# Altium footprint library DD2088PoE_Daisy_Chain.PcbLib: 62 footprints (part 4 of 4)
Each footprint in its own frame and in the unit in brackets; x right, y up, seen from the top. Pads: shape width x height; smd on the part's side, far side on the other; paste and mask are expansions set on the pad; w line width, h text height; cw(c..) or ccw(c..) is an arc to the next point about the centre after c.
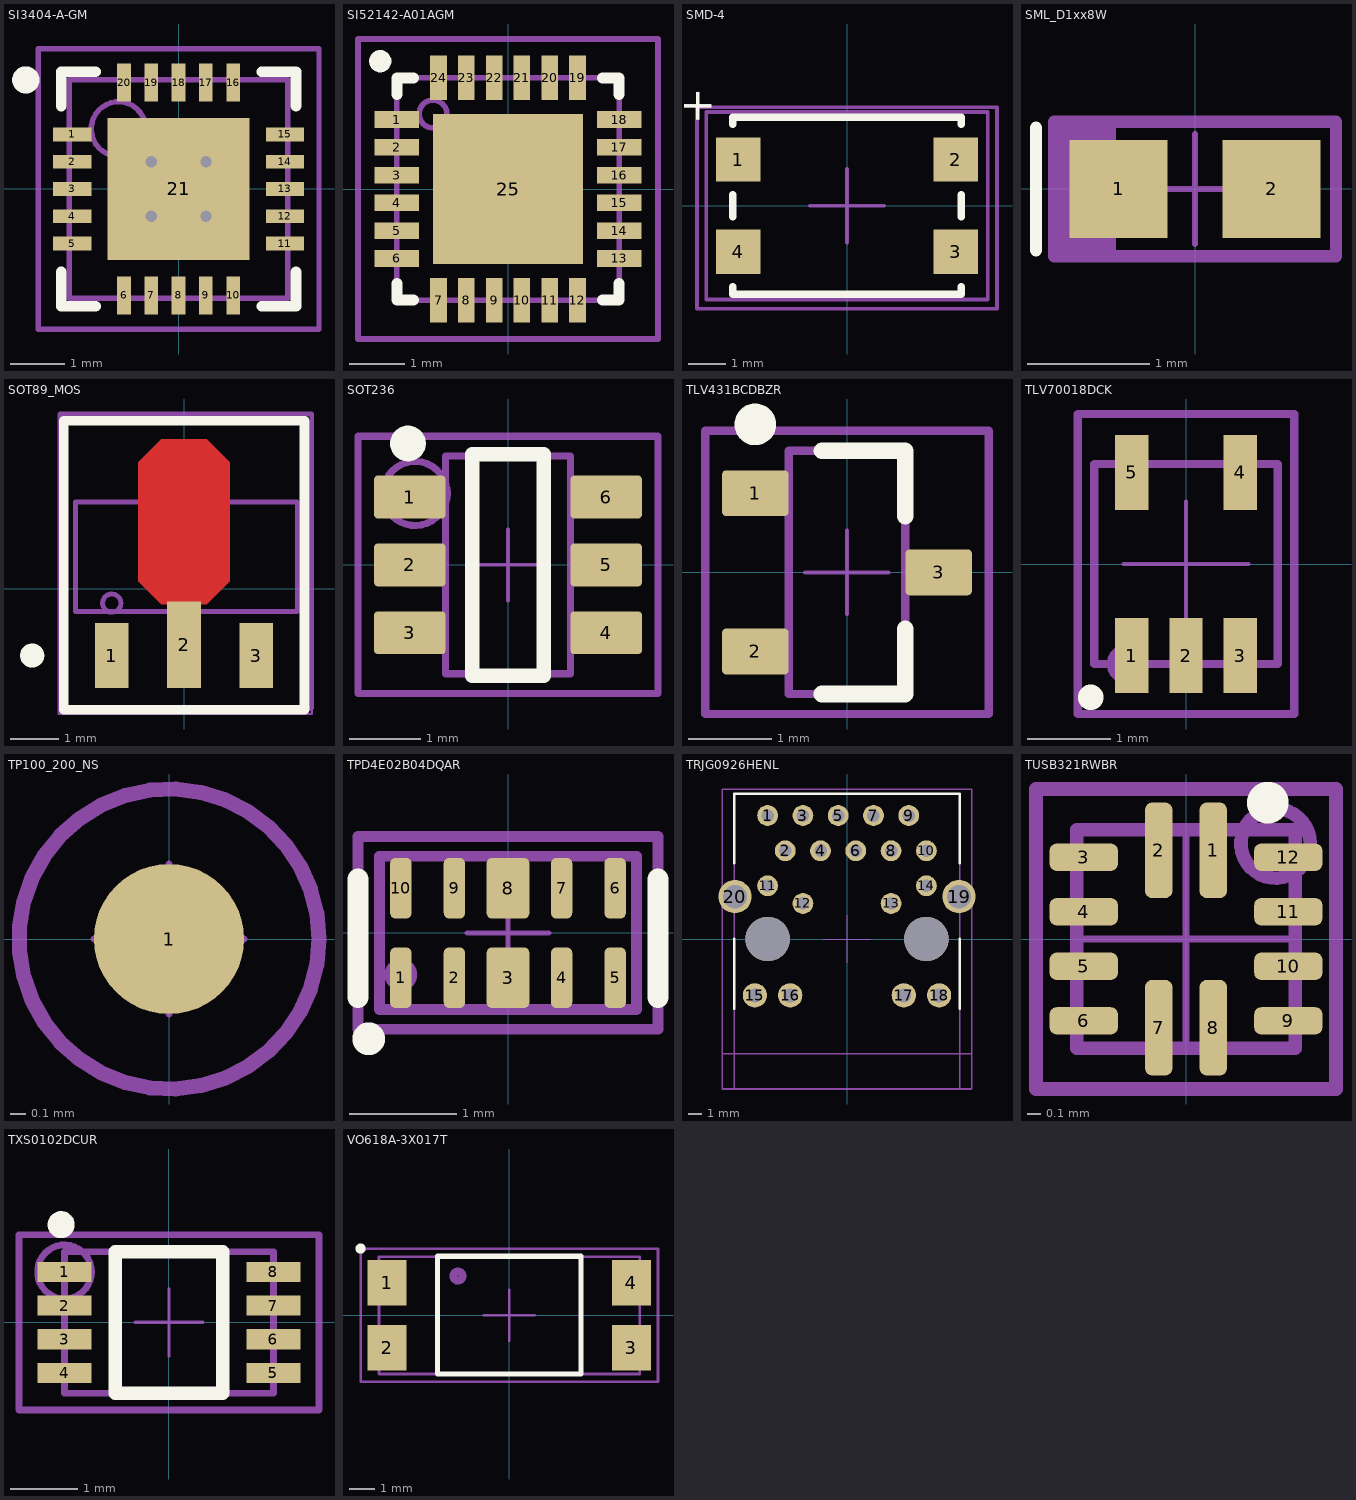
[diagram p3: the footprints below, top view; thin cyan lines are the x and y axes]

## SI3404-A-GM [mm] "QFN, 20-Leads, Body 4.00x4.00mm, Pitch 0.50mm, Thermal Pad 2.60x2.60mm, IPC Medium Density"
height 0.9
pads (21):
  rect 0.7x0.25 smd: 1(-1.95,1) 2(-1.95,0.5) 3(-1.95,0) 4(-1.95,-0.5) 5(-1.95,-1) 11(1.95,-1) 12(1.95,-0.5) 13(1.95,0) 14(1.95,0.5) 15(1.95,1)
  rect 0.25x0.7 smd: 6(-1,-1.95) 7(-0.5,-1.95) 8(0,-1.95) 9(0.5,-1.95) 10(1,-1.95) 16(1,1.95) 17(0.5,1.95) 18(0,1.95) 19(-0.5,1.95) 20(-1,1.95)
  rect 2.6x2.6 smd paste-5: 21(0,0)
via 0.5,-0.5 diameter 0.406 hole 0.203
via -0.5,-0.5 diameter 0.406 hole 0.203
via -0.5,0.5 diameter 0.406 hole 0.203
via 0.5,0.5 diameter 0.406 hole 0.203
Top Overlay:
  circle w0.25: c-2.8,2 r0.125
  lines w0.2: -2.15,-1.525 -2.15,-2.15 -1.525,-2.15 ; -2.15,1.525 -2.15,2.15 -1.525,2.15 ; 1.525,-2.15 2.15,-2.15 2.15,-1.525 ; 1.525,2.15 2.15,2.15 2.15,1.525
Top Paste:
  region: -0.3,0.3 0.3,0.3 0.3,-0.3 -0.3,-0.3
  region: 0.7,0.3 1.3,0.3 1.3,-0.3 0.7,-0.3
  region: -0.3,0.7 -0.3,1.3 0.3,1.3 0.3,0.7
  region: -0.7,-0.3 -1.3,-0.3 -1.3,0.3 -0.7,0.3
  region: 0.3,-0.7 0.3,-1.3 -0.3,-1.3 -0.3,-0.7
  region: 1.3,-0.7 1.3,-1.3 0.7,-1.3 0.7,-0.7
  region: 0.7,1.3 1.3,1.3 1.3,0.7 0.7,0.7
  region: -1.3,0.7 -1.3,1.3 -0.7,1.3 -0.7,0.7
  region: -0.7,-1.3 -1.3,-1.3 -1.3,-0.7 -0.7,-0.7
Top Assembly:
  circle w0.1: c-1.1,1.1 r0.5
  lines w0.1: -2.575,-2.575 2.575,-2.575 2.575,2.575 -2.575,2.575 -2.575,-2.575
  text "'.Designator'" at 0,0 h1
Top Courtyard:
  lines w0.05: -0.5,0 0.5,0 ; 0,-0.5 0,0.5 ; -2.575,-2.575 2.575,-2.575 2.575,2.575 -2.575,2.575 -2.575,-2.575
Top Component Outline:
  lines w0.1: -2.001,-2.001 2.001,-2.001 2.001,2.001 -2.001,2.001 -2.001,-2.001
3D body "Si3404-A-GM.step": height 0.9, standoff 0, extent -2.001,-2.001 2.001,2.001

## SI52142-A01AGM [mm] "24-QFN (4x4)"
height 0.8
pads (25):
  rect 0.8x0.3 smd paste-0.025 mask+0.05: 1(-2,1.25) 2(-2,0.75) 3(-2,0.25) 4(-2,-0.25) 5(-2,-0.75) 6(-2,-1.25) 13(2,-1.25) 14(2,-0.75) 15(2,-0.25) 16(2,0.25) 17(2,0.75) 18(2,1.25)
  rect 0.3x0.8 smd paste-0.025 mask+0.05: 7(-1.25,-2) 8(-0.75,-2) 9(-0.25,-2) 10(0.25,-2) 11(0.75,-2) 12(1.25,-2) 19(1.25,2) 20(0.75,2) 21(0.25,2) 22(-0.25,2) 23(-0.75,2) 24(-1.25,2)
  rect 2.7x2.7 smd paste-3 mask+0.05: 25(0,0)
Top Overlay:
  circle w0.2: c-2.3,2.3 r0.1
  lines w0.2: -2,-1.7 -2,-2 -1.7,-2 ; -2,1.7 -2,2 -1.7,2 ; 1.7,-2 2,-2 2,-1.7 ; 1.7,2 2,2 2,1.7
Top Paste:
  region: 0.1,0.1 1.2,0.1 1.2,1.2 0.1,1.2
  region: -0.1,0.1 -0.1,1.2 -1.2,1.2 -1.2,0.1
  region: -0.1,-0.1 -1.2,-0.1 -1.2,-1.2 -0.1,-1.2
  region: 0.1,-0.1 0.1,-1.2 1.2,-1.2 1.2,-0.1
Top Assembly:
  circle w0.1: c-1.35,1.35 r0.25
  lines w0.1: -2.7,-2.7 -2.7,2.7 2.7,2.7 2.7,-2.7 -2.7,-2.7
  text "'.Designator'" at -0.263,-0.202 h1
Top Courtyard:
  lines w0.05: -1.002,0 0,0 ; 0,-1.002 0,0 ; 0,1.002 0,0 ; 1.002,0 0,0 ; -2.7,-2.7 -2.7,2.7 2.7,2.7 2.7,-2.7 -2.7,-2.7
Top Component Outline:
  lines w0.1: -2,-2 -2,2 2,2 2,-2 -2,-2
3D body "User Library-QFN24-0_5.STEP": height 1, standoff 0, extent -2,-2 2,2

## SMD-4 [mm]
pads (4):
  rect 1.2x1.2 smd mask+0.07: 1(-2.95,1.25) 2(2.95,1.25) 3(2.95,-1.25) 4(-2.95,-1.25)
Top Overlay:
  lines w0.2: -3.1,-2.2 -3.1,-2.4 3.1,-2.4 3.1,-2.2 ; -3.1,-0.3 -3.1,0.3 ; -3.1,2.2 -3.1,2.4 3.1,2.4 3.1,2.2 ; 3.1,-0.3 3.1,0.3
  text "+" at -3.361,2.2 h1.5
Top Assembly:
  lines w0.1: -4.064,-2.794 4.064,-2.794 4.064,2.667 -4.064,2.667 -4.064,-2.794
  text "'.Designator'" at -1.778,-0.254 h1
Top Courtyard:
  lines w0.05: -4.064,-2.794 4.064,-2.794 4.064,2.667 -4.064,2.667 -4.064,-2.794
  lines w0.1: -1,0 0,0 ; 0,-1 0,0 ; 0,1 0,0 ; 1,0 0,0
Top Component Outline:
  lines w0.1: -3.81,-2.54 3.81,-2.54 3.81,2.54 -3.81,2.54 -3.81,-2.54
3D body "CD-HD0x_3d.stp": height 1.06, standoff -0.01, extent -3.075,-2.375 3.075,2.375

## SML_D1xx8W [mm] "Rohm LED SML_D1 series - Chip Diode, 2-Leads, Body 1.60x0.80mm, IPC High Density"
height 0.55
pads (2):
  rect 0.8x0.8 smd: 1(-0.625,0) 2(0.625,0)
Top Overlay:
  lines w0.1: -1.3,-0.5 -1.3,0.5
Top Assembly:
  rectangle: -1.15,-0.55 -0.698,0.55
  lines w0.1: -0.698,-0.55 -0.698,0.55 ; -1.15,-0.55 -1.15,0.55 1.15,0.55 1.15,-0.55 -1.15,-0.55
  text "'.Designator'" at -0.577,-0.264 h1
Top Courtyard:
  lines w0.05: -0.45,0 0.45,0 ; 0,-0.45 0,0.45 ; -1.15,-0.55 -1.15,0.55 1.15,0.55 1.15,-0.55 -1.15,-0.55
3D body "User Library-LED_0603_WS.STEP": height 0.6, standoff 0, extent -0.8,-0.4 0.8,0.4

## SOT89_MOS [mm] "SOT-89; Body 4.6 x 4.25 mm, inc. leads (LxW max)"
height 1.6
pads (3):
  rect 0.7x1.35 smd: 1(-1.5,-1.388) 3(1.5,-1.388)
  rect 0.7x1.8 smd: 2(0,-1.162)
Top Layer:
  region: -0.475,-0.325 -0.95,0.15 -0.95,2.625 -0.475,3.1 0.475,3.1 0.95,2.625 0.95,0.15 0.475,-0.325
Top Overlay:
  circle w0.25: c-3.15,-1.388 r0.125
  lines w0.2: -2.5,-2.512 -2.5,3.487 2.5,3.487 2.5,-2.512 -2.5,-2.512
Top Paste:
  region: -0.35,0.075 -0.7,0.425 -0.7,2.5 -0.35,2.85 0.325,2.85 0.7,2.475 0.7,0.425 0.35,0.075
Top Solder:
  region: -0.475,-0.375 -0.975,0.125 -0.975,2.65 -0.5,3.125 0.5,3.125 0.975,2.65 0.975,0.125 0.475,-0.375
Top Assembly:
  circle w0.1: c-1.5,-0.3 r0.19
  lines w0.1: -2.575,-2.475 2.65,-2.475 2.65,3.625 -2.575,3.625 -2.575,-2.475
  text ".Designator" at 0,0 h1
Top Courtyard:
  lines w0.05: -0.5,0 0.5,0 ; 0,-0.5 0,0.5 ; -2.6,-2.6 2.65,-2.6 2.65,3.6 -2.6,3.6 -2.6,-2.6
Top Component Outline:
  lines w0.1: -2.25,-0.475 -2.25,1.8 2.35,1.8 2.35,-0.475 -2.25,-0.475
3D body "SOT-89.step": height 1.35, standoff 0, extent -2.25,-1.65 2.35,2.6

## SOT236 [mm] "SOT23-6 60mil"
height 1.524
pads (6):
  rrect17% 1x0.6 smd: 1(-1.375,0.95) 2(-1.375,0) 3(-1.375,-0.95) 4(1.375,-0.95) 5(1.375,0) 6(1.375,0.95)
Top Overlay:
  circle w0.25: c-1.4,1.7 r0.125
  lines w0.2: -0.5,-1.55 -0.5,1.55 0.5,1.55 0.5,-1.55 -0.5,-1.55
Top Assembly:
  circle w0.1: c-1.3,1 r0.449
  lines w0.1: -2.1,-1.8 -2.1,1.8 2.1,1.8 2.1,-1.8 -2.1,-1.8
  text ".Designator" at 0,0 h1
Top Courtyard:
  lines w0.05: -0.5,0 0.5,0 ; 0,-0.5 0,0.5 ; -2.1,-1.8 -2.1,1.8 2.1,1.8 2.1,-1.8 -2.1,-1.8
Top Component Outline:
  lines w0.1: -0.875,-1.525 -0.875,1.525 0.875,1.525 0.875,-1.525 -0.875,-1.525
3D body "DBV0006AakaMF06A.stp": height 1.11, standoff -0.01, extent -1.422,-1.461 1.422,1.46

## TLV431BCDBZR [mm] "SOT-23-3"
height 1.12
pads (3):
  rrect18% 0.8x0.55 smd: 1(-1.1,0.95) 2(-1.1,-0.95) 3(1.1,0)
Top Overlay:
  circle w0.25: c-1.1,1.775 r0.125
  lines w0.2: -0.3,-1.461 0.7,-1.461 0.7,-0.675 ; -0.3,1.46 0.7,1.46 0.7,0.675
Top Assembly:
  lines w0.1: -1.7,-1.7 -1.7,1.7 1.7,1.7 1.7,-1.7 -1.7,-1.7
  text "'.Designator'" at -0.425,0.35 h1
Top Courtyard:
  lines w0.05: -0.5,0 0.5,0 ; 0,-0.5 0,0.5 ; -1.7,-1.7 1.7,-1.7 1.7,1.7 -1.7,1.7 -1.7,-1.7
Top Component Outline:
  lines w0.1: -0.7,-1.461 0.7,-1.461 0.7,1.46 -0.7,1.46 -0.7,-1.461
3D body "DBZ0003AakaMF03A.stp": height 0.96, standoff -0.02, extent -1.257,-1.46 1.257,1.461

## TLV70018DCK [mm] "SC70-5 1.1mm"
height 1.1
pads (5):
  rect 0.4x0.9 smd paste-0.025 mask+0.05: 1(-0.65,-1.1) 2(0,-1.1) 3(0.65,-1.1) 4(0.65,1.1) 5(-0.65,1.1)
Top Overlay:
  circle w0.254: c-1.143,-1.6 r0.025
Top Assembly:
  circle w0.1: c-0.7,-1.2 r0.2
  lines w0.1: -1.3,-1.8 -1.3,1.8 1.3,1.8 1.3,-1.8 -1.3,-1.8
  text "'.Designator'" at 0.7,0.3 h1
Top Courtyard:
  lines w0.05: -0.75,0 0,0 ; 0,-0.75 0,0 ; 0,0.75 0,0 ; 0.75,0 0,0 ; -1.3,-1.8 1.3,-1.8 1.3,1.8 -1.3,1.8 -1.3,-1.8
Top Component Outline:
  lines w0.1: -1.1,-1.2 1.1,-1.2 1.1,1.2 -1.1,1.2 -1.1,-1.2
3D body "User Library-SOT353-1.step": height 1.1, standoff 0, extent -1.1,-1.2 1.1,1.2

## TP100_200_NS [mm] "1mm dia pad, 2mm dia clearance, no silk screen"
pads (1):
  round 1 smd paste-2: 1(0,0)
Top Assembly:
  circle w0.1: c0,0 r1
  text "'.Designator'" at -0.743,-0.307 h0.75
Top Courtyard:
  circle w0.05: c0,0 r1
  lines w0.05: -0.5,0 0.5,0 ; 0,-0.5 0,0.5

## TPD4E02B04DQAR [mm] "TPD4E02B04DQAR"
height 0.55
pads (10):
  rrect50% 0.2x0.565 smd mask+0.07: 1(-1,-0.417) 2(-0.5,-0.417) 4(0.5,-0.417) 5(1,-0.417) 6(1,0.417) 7(0.5,0.417) 9(-0.5,0.417) 10(-1,0.417)
  rrect25% 0.4x0.565 smd mask+0.07: 3(0,-0.417) 8(0,0.417)
Top Overlay:
  circle w0.254: c-1.3,-0.988 r0.025
  lines w0.2: -1.4,-0.6 -1.4,0.5 ; 1.4,-0.6 1.4,0.5
Top Assembly:
  circle w0.254: c-1,-0.39 r0.025
  lines w0.1: -1.4,-0.9 1.4,-0.9 1.4,0.9 -1.4,0.9 -1.4,-0.9
  text "'.Designator'" at -0.547,-0.2 h1
Top Courtyard:
  lines w0.05: -0.381,0 0.381,0 ; 0,-0.381 0,0.381 ; -1.4,-0.9 1.4,-0.9 1.4,0.9 -1.4,0.9 -1.4,-0.9
Top Component Outline:
  lines w0.1: -1.2,-0.715 1.2,-0.715 1.2,0.715 -1.2,0.715 -1.2,-0.715
3D body: height 0.55, standoff 0, extent -1.2,-0.715 1.2,0.715

## TRJG0926HENL [mm] "TRXCOM TRJG0926HENL 1000BASE-T PoE"
height 13.3
pads (22):
  round 1.5 hole 0.9: 1(-5.715,8.89) 2(-4.445,6.35) 3(-3.175,8.89) 4(-1.905,6.35) 5(-0.635,8.89) 6(0.635,6.35) 7(1.905,8.89) 8(3.175,6.35) 9(4.445,8.89) 10(5.715,6.35) 11(-5.715,3.83) 12(-3.175,2.56) 13(3.175,2.56) 14(5.715,3.83)
  round 1.75 hole 1.02: 15(-6.63,-4.06) 16(-4.09,-4.06) 17(4.09,-4.06) 18(6.63,-4.06)
  round 2.4 hole 1.7: 19(8.064,3.05) 20(-8.064,3.05)
  round 3.2 hole 3.2: ""(-5.715,0) ""(5.715,0)
Top Overlay:
  lines w0.2: -8.115,-5 -8.115,0 ; -8.115,5.45 -8.115,10.45 8.115,10.45 8.115,5.45 ; 8.115,-5 8.115,0
Top Assembly:
  lines w0.1: -9,-8.26 9,-8.26 ; -9,-10.8 9,-10.8 9,10.8 -9,10.8 -9,-10.8
  text "'.Designator'" at 0,0 h1
Top Courtyard:
  lines w0.05: -1.7,0 0,0 ; 0,-1.7 0,0 ; 0,1.7 0,0 ; 1.7,0 0,0 ; -9,-10.8 -9,10.8 9,10.8 9,-10.8 -9,-10.8
Top Component Outline:
  lines w0.1: -8.115,-10.8 -8.115,10.45 8.115,10.45 8.115,-10.8 -8.115,-10.8
3D body "TRJG0926HENL.stp": height 13.65, standoff -3.65, extent -8.115,-10.8 8.115,10.45

## TUSB321RWBR [mm] "X2QFN-12 1.6x1.6"
height 0.4
pads (12):
  rrect50% 0.2x0.7 smd mask+0.05: 1(0.2,0.65) 2(-0.2,0.65) 7(-0.2,-0.65) 8(0.2,-0.65)
  rrect50% 0.5x0.2 smd mask+0.05: 3(-0.75,0.6) 4(-0.75,0.2) 5(-0.75,-0.2) 6(-0.75,-0.6) 9(0.75,-0.6) 10(0.75,-0.2) 11(0.75,0.2) 12(0.75,0.6)
Top Overlay:
  circle w0.254: c0.6,1 r0.025
Top Assembly:
  circle w0.1: c0.657,0.7 r0.254
  lines w0.1: -1.1,-1.1 -1.1,1.1 1.1,1.1 1.1,-1.1 -1.1,-1.1
  text "'.Designator'" at 0.769,0.324 h1
Top Courtyard:
  lines w0.05: -0.8,0 0,0 ; 0,-0.8 0,0 ; 0,0.8 0,0 ; 0.8,0 0,0 ; -1.1,-1.1 -1.1,1.1 1.1,1.1 1.1,-1.1 -1.1,-1.1
Top Component Outline:
  lines w0.1: -0.8,-0.8 0.8,-0.8 0.8,0.8 -0.8,0.8 -0.8,-0.8
3D body: height 0.4, standoff 0, extent -0.8,-0.8 0.8,0.8

## TXS0102DCUR [mm] "TSSOP, 8-Leads, Body 2.00x2.30mm, Pitch 0.50mm"
height 0.9
pads (8):
  rect 0.8x0.3 smd mask+0.05: 1(-1.55,0.75) 2(-1.55,0.25) 3(-1.55,-0.25) 4(-1.55,-0.75) 5(1.55,-0.75) 6(1.55,-0.25) 7(1.55,0.25) 8(1.55,0.75)
Top Overlay:
  circle w0.2: c-1.6,1.45 r0.1
  lines w0.2: -0.8,-1.05 -0.8,1.05 0.8,1.05 0.8,-1.05 -0.8,-1.05
Top Assembly:
  circle w0.1: c-1.55,0.75 r0.4
  lines w0.1: -2.225,-1.3 2.225,-1.3 2.225,1.3 -2.225,1.3 -2.225,-1.3
  text "'.Designator'" at -0.769,-0.136 h1
Top Courtyard:
  lines w0.05: -0.5,0 0.5,0 ; 0,-0.5 0,0.5 ; -2.225,-1.3 -2.225,1.3 2.225,1.3 2.225,-1.3 -2.225,-1.3
Top Component Outline:
  lines w0.1: -1.549,-1.05 1.549,-1.05 1.549,1.05 -1.549,1.05 -1.549,-1.05
3D body "TSSOP50P310X90-8N.step": height 0.9, standoff 0, extent -1.549,-1.05 1.549,1.05

## VO618A-3X017T [mm] "4-SMD, Gull Wing"
height 3.8
pads (4):
  rect 1.52x1.78 smd: 1(-4.76,1.27) 2(-4.76,-1.27) 3(4.76,-1.27) 4(4.76,1.27)
Top Overlay:
  circle w0.2: c-5.8,2.6 r0.1
  lines w0.2: -2.8,2.29 -2.8,-2.29 2.8,-2.29 2.8,2.29 ; -2.8,2.3 2.8,2.3
Top Assembly:
  circle w0.3: c-2.003,1.53 r0.18
  circle w0.3: c-2.003,1.53 r0.18
  lines w0.1: -5.8,-2.6 5.8,-2.6 5.8,2.6 -5.8,2.6 -5.8,-2.6
  text "'.Designator'" at -0.448,-0.025 h1
Top Courtyard:
  lines w0.05: -5.8,-2.6 5.8,-2.6 5.8,2.6 -5.8,2.6 -5.8,-2.6
  lines w0.1: -1,0 0,0 ; 0,-1 0,0 ; 0,1 0,0 ; 1,0 0,0
Top Component Outline:
  lines w0.1: -5.08,-2.29 5.08,-2.29 5.08,2.29 -5.08,2.29 -5.08,-2.29
3D body "DIP4-OP7.STEP": height 3.75, standoff 0.06, extent -5.08,-2.29 5.08,2.29